# Altium footprint library 常用元件封装库.PcbLib: 1310 footprints (part 69 of 83)
Each footprint in its own frame and in the unit in brackets; x right, y up, seen from the top. Pads: shape width x height; smd on the part's side, far side on the other; paste and mask are expansions set on the pad; w line width, h text height; cw(c..) or ccw(c..) is an arc to the next point about the centre after c.
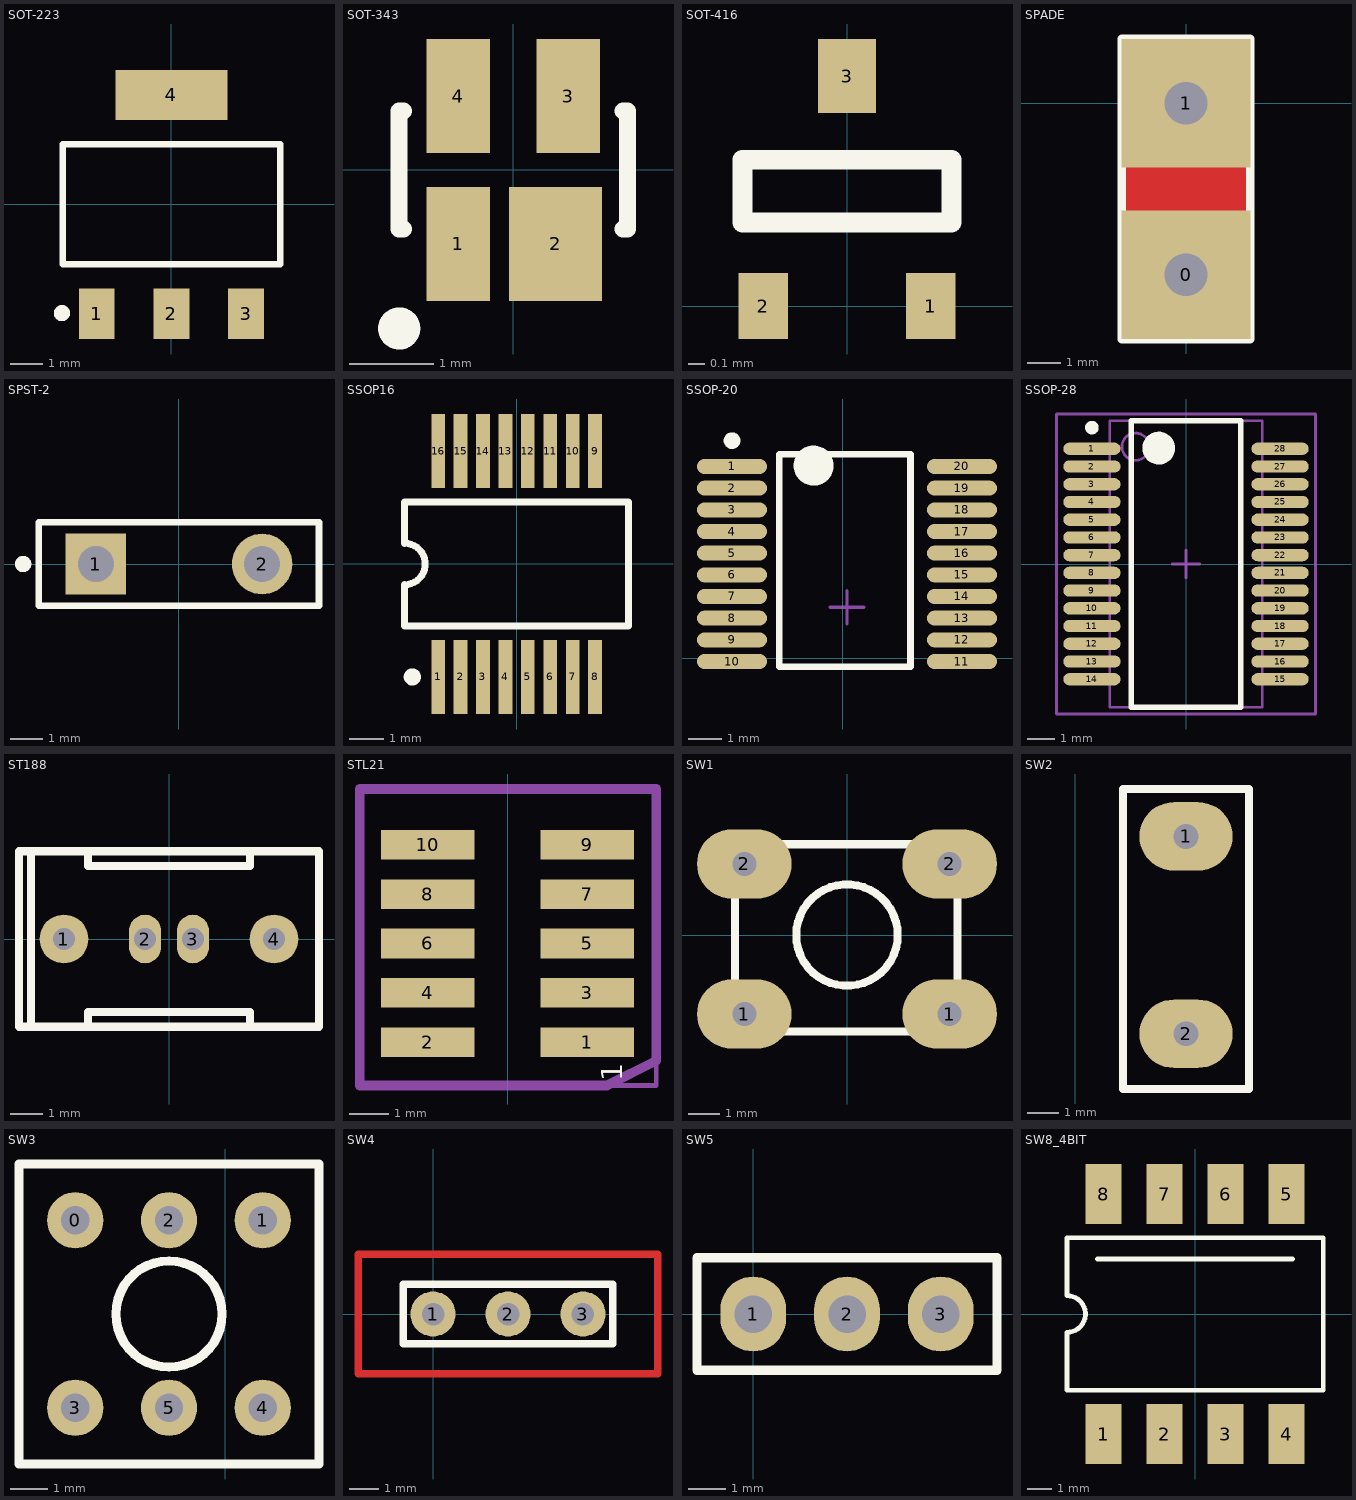
[diagram p68: the footprints below, top view; thin cyan lines are the x and y axes]

## SOT-223 [mm]
height 1.8
pads (4):
  rect 1.1x1.55 smd: 1(-2.3,-3.375) 2(0,-3.375) 3(2.3,-3.375)
  rect 3.45x1.55 smd: 4(0,3.375)
Top Overlay:
  circle w0.25: c-3.376,-3.353 r0.125
  lines w0.2: -3.35,-1.85 3.35,-1.85 3.35,1.85 -3.35,1.85 -3.35,-1.85
3D body: height 0.3, standoff 0, extent 1.905,-3.937 2.794,-2.032
3D body: height 0.3, standoff 0, extent -0.508,-3.937 0.381,-2.032
3D body: height 0.3, standoff 0, extent -2.794,-3.937 -1.905,-2.032
3D body: height 0.3, standoff 0, extent -1.651,2.159 1.651,3.429
3D body: height 0.8, standoff 0, extent -3.302,-2.032 3.302,2.159

## SOT-343 [mm] "SOT-343; 4 Leads; Body 2.2 x 2.2 mm, inc. leads (LxW max)"
height 1
pads (4):
  rect 0.75x1.35 smd: 1(-0.65,-0.875) 3(0.65,0.875) 4(-0.65,0.875)
  rect 1.1x1.35 smd: 2(0.5,-0.875)
Top Overlay:
  circle w0.25: c-1.35,-1.875 r0.125
  lines w0.2: -1.3,-0.7 -1.35,-0.7 -1.35,0.7 -1.3,0.7 ; 1.3,-0.7 1.35,-0.7 1.35,0.7 1.3,0.7

## SOT-416 [mm]
height 0.7
pads (3):
  rect 0.3x0.4 smd: 1(0.508,0) 2(-0.508,0)
  rect 0.35x0.45 smd: 3(0,1.397)
Top Overlay:
  lines w0.12: -0.635,0.508 -0.635,0.889 0.635,0.889 0.635,0.508 -0.635,0.508

## SPADE [mil]
pads (2):
  rect 150x150 hole 50: 0(0,-200) 1(0,0)
Top Layer:
  rectangle: -75,-150 75,-50
Bottom Layer:
  rectangle: -75,-150 75,-50
Top Overlay:
  lines w10: -75,-275 -75,75 75,75 75,-275 -75,-275

## SPST-2 [mm] "Circuit Breaker; 2 Leads"
pads (2):
  rect 1.85x1.85 hole 1.1: 1(-2.54,0)
  round 1.85 hole 1.1: 2(2.54,0)
Top Overlay:
  circle w0.25: c-4.761,-0.001 r0.125
  lines w0.2: -4.28,-1.27 4.28,-1.27 4.28,1.27 -4.28,1.27 -4.28,-1.27

## SSOP16 [mm] "SSOP; 16 Leads; Body Width 5.3 mm; Pitch 0.65 mm"
height 2
pads (16):
  rect 0.4x2.15 smd: 1(-2.275,-3.275) 2(-1.625,-3.275) 3(-0.975,-3.275) 4(-0.325,-3.275) 5(0.325,-3.275) 6(0.975,-3.275) 7(1.625,-3.275) 8(2.275,-3.275) 9(2.275,3.275) 10(1.625,3.275) 11(0.975,3.275) 12(0.325,3.275) 13(-0.325,3.275) 14(-0.975,3.275) 15(-1.625,3.275) 16(-2.275,3.275)
Top Overlay:
  circle w0.25: c-3.025,-3.275 r0.125
  lines w0.2: -3.25,-1.8 3.25,-1.8 3.25,1.8 -3.25,1.8 -3.25,0.6 cw(c-3.25,0) -3.25,-0.6 -3.25,-1.8

## SSOP-20 [mm]
pads (20):
  oval 2.1x0.45 smd: 1(-3.323,5.749) 2(-3.323,5.099) 3(-3.323,4.449) 4(-3.323,3.799) 5(-3.323,3.149) 6(-3.323,2.499) 7(-3.323,1.849) 8(-3.323,1.199) 9(-3.323,0.549) 10(-3.323,-0.101) 11(3.577,-0.101) 12(3.577,0.549) 13(3.577,1.199) 14(3.577,1.849) 15(3.577,2.499) 16(3.577,3.149) 17(3.577,3.799) 18(3.577,4.449) 19(3.577,5.099) 20(3.577,5.749)
Top Overlay:
  circle w0.25: c-3.323,6.524 r0.125
  circle w0.6: c-0.873,5.774 r0.3
  lines w0.2: -1.905,-0.254 -1.905,6.119 2.032,6.119 2.032,-0.254 -1.905,-0.254
Mechanical 15:
  lines w0.1: -0.373,1.524 0.627,1.524 ; 0.127,1.024 0.127,2.024
3D body "SW3dPS-SSOP 20 PIN.STEP": height 2.03, standoff 0.04, extent -3.696,-0.381 4.204,6.119

## SSOP-28 [mm] "FT232"
height 2
pads (28):
  oval 2.1x0.45 smd: 1(-3.45,4.225) 2(-3.45,3.575) 3(-3.45,2.925) 4(-3.45,2.275) 5(-3.45,1.625) 6(-3.45,0.975) 7(-3.45,0.325) 8(-3.45,-0.325) 9(-3.45,-0.975) 10(-3.45,-1.625) 11(-3.45,-2.275) 12(-3.45,-2.925) 13(-3.45,-3.575) 14(-3.45,-4.225) 15(3.45,-4.225) 16(3.45,-3.575) 17(3.45,-2.925) 18(3.45,-2.275) 19(3.45,-1.625) 20(3.45,-0.975) 21(3.45,-0.325) 22(3.45,0.325) 23(3.45,0.975) 24(3.45,1.625) 25(3.45,2.275) 26(3.45,2.925) 27(3.45,3.575) 28(3.45,4.225)
Top Overlay:
  circle w0.25: c-3.45,5 r0.125
  circle w0.6: c-1,4.25 r0.3
  lines w0.2: -2,-5.25 -2,5.25 2,5.25 2,-5.25 -2,-5.25
Mechanical 13:
  circle w0.1: c-1.85,4.3 r0.5
  lines w0.1: -2.8,-5.25 -2.8,5.25 2.8,5.25 2.8,-5.25 -2.8,-5.25
Mechanical 15:
  lines w0.1: -0.5,0 0.5,0 ; 0,-0.5 0,0.5 ; -4.75,-5.5 -4.75,5.5 4.75,5.5 4.75,-5.5 -4.75,-5.5
3D body: height 2, standoff 0.09, extent -2.8,-5.25 2.8,5.25

## ST188 [mm] "反射式光电传感器"
height 8.2
pads (4):
  round 1.524 hole 0.7: 1(-3.29,0) 4(3.29,0)
  oval 1x1.524 hole 0.7: 2(-0.75,0) 3(0.75,0)
Top Overlay:
  lines w0.254: -4.318,-2.75 -4.318,2.75 ; -2.54,-2.75 -2.54,-2.286 2.54,-2.286 2.54,-2.75 ; -2.54,2.75 -2.54,2.286 2.54,2.286 2.54,2.75 ; -4.7,-2.75 -4.7,2.75 4.7,2.75 4.7,-2.75 -4.7,-2.75

## STL21 [mm]
pads (10):
  rect 2.4x0.76 smd: 1(2.045,-9.046) 2(-2.055,-9.046) 3(2.045,-7.776) 4(-2.055,-7.776) 5(2.045,-6.506) 6(-2.055,-6.506) 7(2.045,-5.236) 8(-2.055,-5.236) 9(2.045,-3.966) 10(-2.055,-3.966)
Top Overlay:
  text "1" at 2.945,-10.046 h0.53
Mechanical 1:
  lines w0.254: -3.8,-10.156 -3.8,-2.536 3.82,-2.536 3.82,-9.521 2.55,-10.156 -3.8,-10.156
Mechanical 2:
  lines w0.127: -3.8,-10.156 3.82,-10.156 3.82,-2.536 -3.8,-2.536 -3.8,-10.156

## SW1 [mm]
pads (4):
  oval 2.999x2.2 hole 0.762: 1(-3.25,-2.5) 1(3.25,-2.5) 2(-3.25,2.25) 2(3.25,2.25)
Top Overlay:
  circle w0.254: c0,0 r1.606
  lines w0.254: -3.55,-2.3 -3.55,-3.042 ; 3.125,-3.048 3.444,-3.048 3.5,-2.992 3.556,-3.048 ; 3.125,2.875 3.5,2.875 ; 3.25,-3.048 3.556,-3.048 ; 3.5,-2.948 3.5,2.875 ; -3.55,-3.042 -3.55,2.875 3.5,2.875 ; -3.55,-3.042 -3.544,-3.048 3.556,-3.048

## SW2 [mm]
pads (2):
  oval 3x2.2 hole 0.8: 1(3.556,-2.54) 2(3.556,-8.89)
Top Overlay:
  lines w0.254: 1.524,-10.668 1.524,-1.016 5.588,-1.016 5.588,-10.668 1.524,-10.668

## SW3 [mil]
pads (6):
  round 60 hole 30: 0(-160,340) 1(40,340) 2(-60,340) 3(-160,140) 4(40,140) 5(-60,140)
Top Overlay:
  circle w10: c-60,240 r56.57
  lines w10: -220,80 100,80 100,400 -220,400 -220,80

## SW4 [mil]
pads (3):
  round 60 hole 30: 1(0,0) 2(100,0) 3(200,0)
Top Layer:
  lines w10: -80,80 300,80 300,-80 -100,-80 -100,80 -60,80
Top Overlay:
  lines w10: -40,-40 240,-40 240,40 -40,40 -40,-40

## SW5 [mil]
pads (3):
  oval 70x80 hole 40: 1(0,0) 2(100,0) 3(200,0)
Top Overlay:
  lines w10: -60,-60 -60,60 260,60 260,-60 -60,-60

## SW8_4BIT [mm] "贴片拨码开关"
height 1.75
pads (8):
  rect 1.5x2.5 smd: 1(-3.81,-5) 2(-1.27,-5) 3(1.27,-5) 4(3.81,-5) 5(3.81,5) 6(1.27,5) 7(-1.27,5) 8(-3.81,5)
Top Overlay:
  lines w0.2: -4.064,2.286 4.064,2.286 ; -5.334,-3.175 -5.334,-0.762 ccw(c-5.334,0) -5.334,0.762 -5.334,3.175 5.334,3.175 5.334,-3.175 -5.334,-3.175
3D body: height 2, standoff 0, extent -5.207,-3.429 5.08,3.429
3D body: height 2.05, standoff 2, extent -4.572,-2.032 -3.048,2.413
3D body: height 2.05, standoff 2, extent -2.032,-2.032 -0.508,2.413
3D body: height 2.05, standoff 2, extent 0.508,-2.032 2.032,2.413
3D body: height 2.05, standoff 2, extent 3.048,-2.032 4.572,2.413
3D body: height 2.15, standoff 2.05, extent -4.572,0.889 -3.048,2.413
3D body: height 2.15, standoff 2.05, extent -2.032,-2.032 -0.508,-0.508
3D body: height 2.15, standoff 2.05, extent 0.508,0.889 2.032,2.413
3D body: height 2.15, standoff 2.05, extent 3.048,0.889 4.572,2.413